# Altium footprint library generated_footprints.PcbLib: 38 footprints (part 2 of 3)
Each footprint in its own frame and in the unit in brackets; x right, y up, seen from the top. Pads: shape width x height; smd on the part's side, far side on the other; paste and mask are expansions set on the pad; w line width, h text height; cw(c..) or ccw(c..) is an arc to the next point about the centre after c.
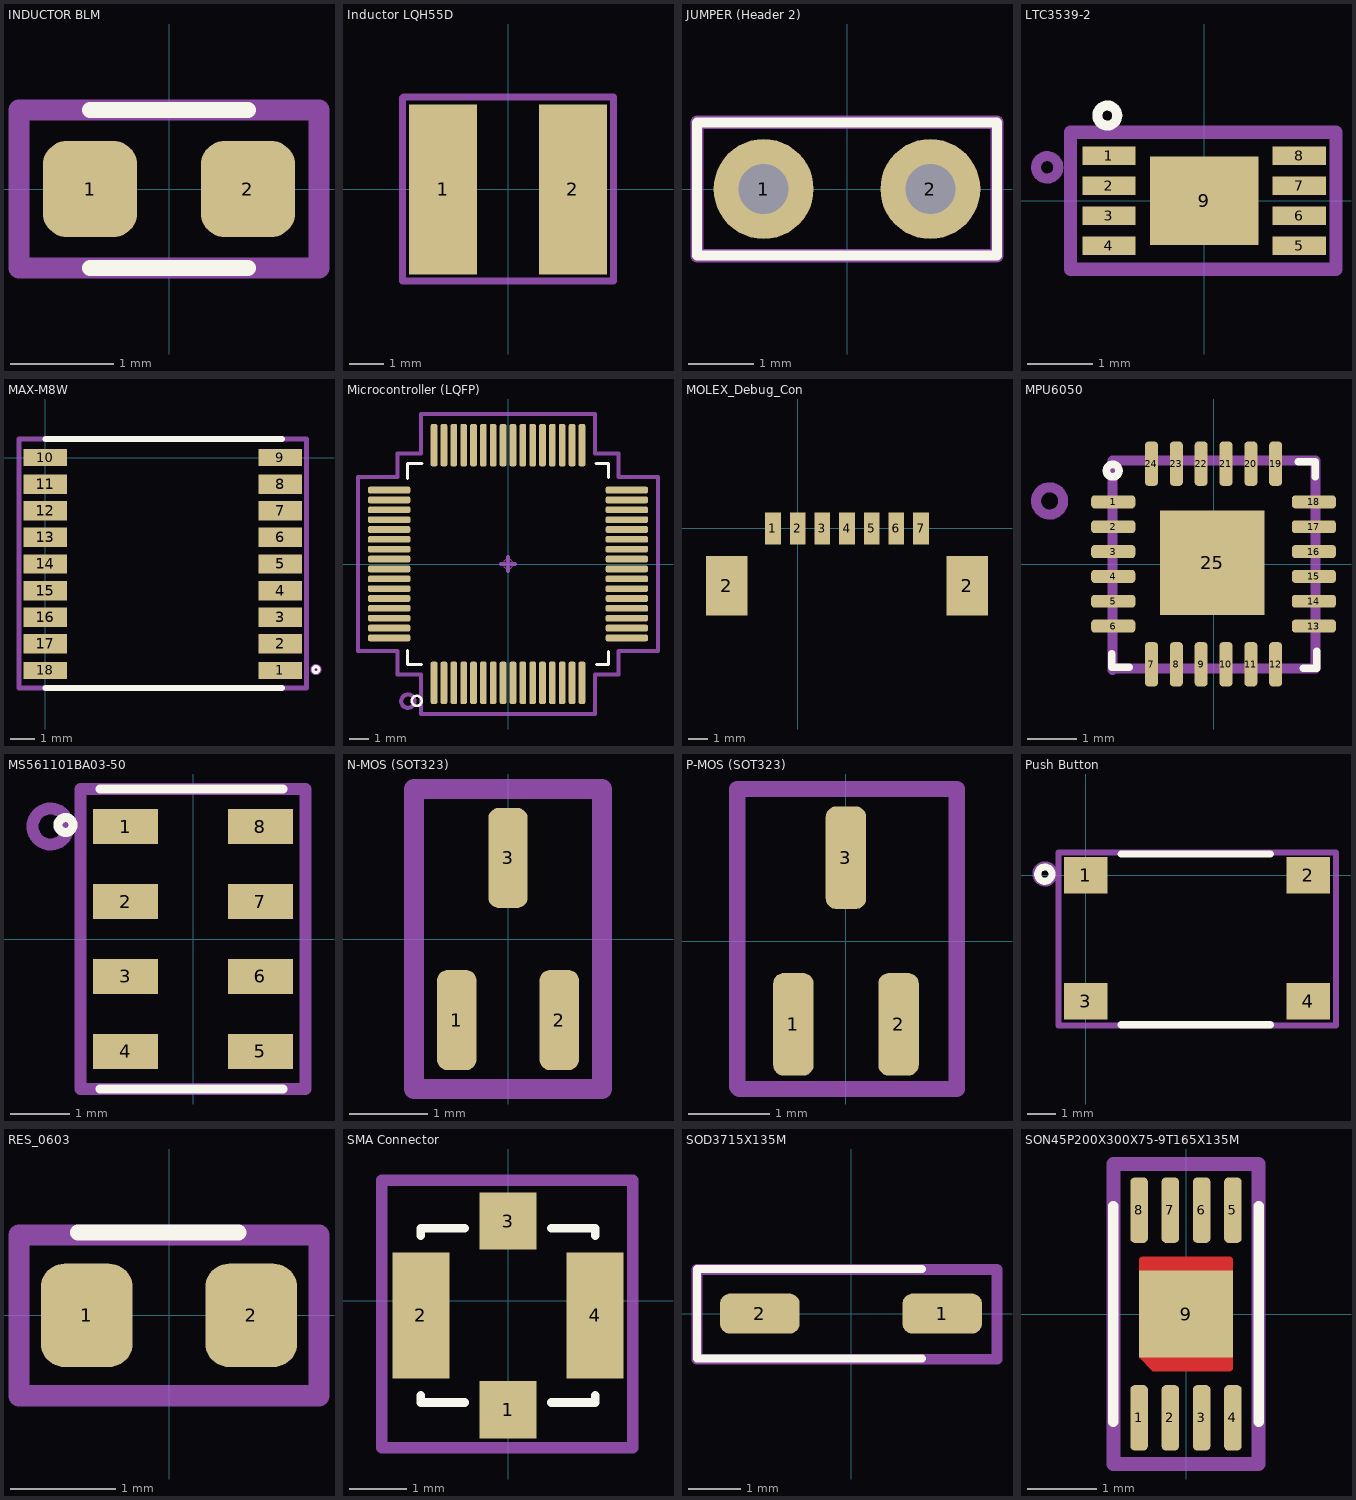
[diagram p1: the footprints below, top view; thin cyan lines are the x and y axes]

## INDUCTOR BLM [mm] "Inductor, Chip; 1.60 mm L X 0.80 mm W X 0.90 mm H body"
height 0.9
pads (2):
  rrect51% 0.91x0.93 smd: 1(-0.762,0) 2(0.762,0)
Top Overlay:
  lines w0.152: -0.762,-0.762 0.762,-0.762 ; -0.762,0.762 0.762,0.762
Mechanical 15:
  lines w0.203: -1.448,-0.762 1.448,-0.762 1.448,0.762 -1.448,0.762 -1.448,-0.762
  text ".Designator" at -1.041,-0.483 h1.52
3D body "User Library-INDC1608X___.step": height 1, standoff 0, extent -0.8,-0.4 0.8,0.4

## Inductor LQH55D [mm]
pads (2):
  rect 2x5 smd: 1(-1.905,0) 2(1.905,0)
Mechanical 15:
  lines w0.203: -3.099,2.692 -3.099,-2.692 3.099,-2.692 3.099,2.718 -3.073,2.718
  text ".Designator" at -0.813,-0.483 h1.52
3D body "User Library-LQH55D series.STEP": height 4.7, standoff 0, extent -2.85,-2.5 2.85,2.5

## JUMPER (Header 2) [mil]
pads (2):
  round 60 hole 30: 1(-50,0) 2(50,0)
Top Overlay:
  lines w6: -90,-40 -90,40 90,40 90,-40 -90,-40
Mechanical 15:
  lines w8: -90,-40 -90,40 90,40 90,-40 -90,-40
  text ".Designator" at -40,-16 h60
3D body "User Library-1x2 TH Pitch 2_54mm.step": height 373.85, standoff -125.98, extent -100,-50 100,50

## LTC3539-2 [mil]
pads (9):
  rect 32x11 smd paste-1000 mask-1000: 1(-57,27) 2(-57,9) 3(-57,-9) 4(-57,-27) 5(57,-27) 6(57,-9) 7(57,9) 8(57,27)
  rect 65x53 smd paste-1000 mask-1000: 9(0,0)
Top Overlay:
  circle w6: c-58,51 r6
Top Paste:
  region: -73,21.5 -41,21.5 -41,32.5 -73,32.5
  region: -73,3.5 -41,3.5 -41,14.5 -73,14.5
  region: -73,-14.5 -41,-14.5 -41,-3.5 -73,-3.5
  region: -73,-32.5 -41,-32.5 -41,-21.5 -73,-21.5
  region: 41,-32.5 73,-32.5 73,-21.5 41,-21.5
  region: 41,-14.5 73,-14.5 73,-3.5 41,-3.5
  region: 41,3.5 73,3.5 73,14.5 41,14.5
  region: 41,21.5 73,21.5 73,32.5 41,32.5
  region: -32.5,-26.5 32.5,-26.5 32.5,26.5 -32.5,26.5
Top Solder:
  region: -76,17.56 -39,17.56 -39,36.44 -76,36.44
  region: -76,-0.44 -39,-0.44 -39,18.44 -76,18.44
  region: -76,-18.44 -39,-18.44 -39,0.44 -76,0.44
  region: -76,-36.44 -39,-36.44 -39,-17.56 -76,-17.56
  region: 39,-36.44 75,-36.44 75,-17.56 39,-17.56
  region: 39,-18.44 75,-18.44 75,0.44 39,0.44
  region: 39,-0.44 75,-0.44 75,18.44 39,18.44
  region: 39,17.56 75,17.56 75,36.44 39,36.44
  region: -35,-30 35,-30 35,30 -35,30
Mechanical 15:
  circle w6: c-94,20 r6.71
  lines w8: -80,-41 -80,41 79,41 79,-41 -80,-41
  text ".Designator" at -41,-17 h60
3D body "User Library-DFN-8-1.step": height 29.53, standoff -1.97, extent -61.02,-39.36 61.03,39.37

## MAX-M8W [mm]
height 10
pads (18):
  rect 1.8x0.7 smd mask+0.089: 1(9.7,-8.8) 9(9.7,0) 10(0,0) 18(0,-8.8)
  rect 1.8x0.8 smd mask+0.089: 2(9.7,-7.7) 3(9.7,-6.6) 4(9.7,-5.5) 5(9.7,-4.4) 6(9.7,-3.3) 7(9.7,-2.2) 8(9.7,-1.1) 11(0,-1.1) 12(0,-2.2) 13(0,-3.3) 14(0,-4.4) 15(0,-5.5) 16(0,-6.6) 17(0,-7.7)
Top Overlay:
  circle w0.127: c11.176,-8.763 r0.127
  lines w0.254: 0,-9.525 9.779,-9.525 ; 0,0.762 9.779,0.762
Mechanical 15:
  circle w0.203: c11.176,-8.763 r0.127
  lines w0.203: -1.092,-9.525 10.795,-9.525 10.795,0.762 -1.092,0.762 -1.092,-9.525
  text ".Designator" at 3.327,-4.877 h1.52
3D body "MAX.STEP": height 2.47, standoff 0, extent -0.024,-9.465 9.676,0.635

## Microcontroller (LQFP) [mm] "Quad Flat Pack (QFP), 0.50 mm pitch; square, 16 pin X 16 pin, 10.00 mm L X 10.00 mm W X 1.20 mm H body"
height 1.2
pads (64):
  rrect53% 0.34x2.15 smd: 1(-3.75,-6.03) 2(-3.25,-6.03) 3(-2.75,-6.03) 4(-2.25,-6.03) 5(-1.75,-6.03) 6(-1.25,-6.03) 7(-0.75,-6.03) 8(-0.25,-6.03) 9(0.25,-6.03) 10(0.75,-6.03) 11(1.25,-6.03) 12(1.75,-6.03) 13(2.25,-6.03) 14(2.75,-6.03) 15(3.25,-6.03) 16(3.75,-6.03) 33(3.75,6.03) 34(3.25,6.03) 35(2.75,6.03) 36(2.25,6.03) 37(1.75,6.03) 38(1.25,6.03) 39(0.75,6.03) 40(0.25,6.03) 41(-0.25,6.03) 42(-0.75,6.03) 43(-1.25,6.03) 44(-1.75,6.03) 45(-2.25,6.03) 46(-2.75,6.03) 47(-3.25,6.03) 48(-3.75,6.03)
  rrect53% 2.15x0.34 smd: 17(6.03,-3.75) 18(6.03,-3.25) 19(6.03,-2.75) 20(6.03,-2.25) 21(6.03,-1.75) 22(6.03,-1.25) 23(6.03,-0.75) 24(6.03,-0.25) 25(6.03,0.25) 26(6.03,0.75) 27(6.03,1.25) 28(6.03,1.75) 29(6.03,2.25) 30(6.03,2.75) 31(6.03,3.25) 32(6.03,3.75) 49(-6.03,3.75) 50(-6.03,3.25) 51(-6.03,2.75) 52(-6.03,2.25) 53(-6.03,1.75) 54(-6.03,1.25) 55(-6.03,0.75) 56(-6.03,0.25) 57(-6.03,-0.25) 58(-6.03,-0.75) 59(-6.03,-1.25) 60(-6.03,-1.75) 61(-6.03,-2.25) 62(-6.03,-2.75) 63(-6.03,-3.25) 64(-6.03,-3.75)
Top Overlay:
  circle w0.127: c-4.629,-6.943 r0.254
  lines w0.15: -5.1,-4.394 -5.1,-5.1 -4.394,-5.1 ; -5.1,4.343 -5.1,5.1 -4.369,5.1 ; 4.47,5.1 5.1,5.1 5.1,4.394 ; 4.496,-5.1 5.1,-5.1
  lines w0.152: 5.1,-5.1 5.1,-4.445
Mechanical 15:
  circle w0.203: c-5.08,-6.96 r0.339
  circle w0.05: c0,0 r0.25
  lines w0.203: -0.35,0 0.35,0 ; 0,-0.35 0,0.35 ; -7.61,-4.42 -5.6,-4.42 -5.6,-5.6 -4.42,-5.6 -4.42,-7.61 4.42,-7.61 4.42,-5.6 5.6,-5.6 5.6,-4.42 7.61,-4.42 7.61,4.42 5.6,4.42 5.6,5.6 4.42,5.6 4.42,7.61 -4.42,7.61 -4.42,5.6 -5.6,5.6 -5.6,4.42 -7.61,4.42 -7.61,-4.42
  text ".Designator" at -1.016,-1.956 h2.54
3D body "User Library-LQFP64-1.step": height 1.56, standoff 0, extent -6,-6 6,6

## MOLEX_Debug_Con [mm]
pads (9):
  rect 0.8x1.6 smd: 1(-1.25,0) 2(0,0) 3(1.25,0) 4(2.5,0) 5(3.75,0) 6(5,0) 7(6.25,0)
  rect 2.1x3 smd: 2(-3.6,-2.9) 2(8.6,-2.9)
3D body "532610771.stp": height 3.4, standoff 0, extent -4.45,-4.7 9.45,0.5

## MPU6050 [mm] "Quad Flat No-Lead (QFN with Tab), 0.50 mm pitch; square, 6 pin X 6 pin, 4.00 mm L X 4.00 mm W X 0.95 mm H body"
height 0.95
pads (25):
  rrect54% 0.89x0.26 smd mask+0.114: 1(-2.02,1.25) 6(-2.02,-1.25) 13(2.02,-1.25) 18(2.02,1.25)
  rrect54% 0.89x0.26 smd mask+0.127: 2(-2.02,0.75) 3(-2.02,0.25) 4(-2.02,-0.25) 5(-2.02,-0.75) 14(2.02,-0.75) 15(2.02,-0.25) 16(2.02,0.25) 17(2.02,0.75)
  rrect54% 0.26x0.89 smd mask+0.114: 7(-1.25,-2.02) 12(1.25,-2.02) 19(1.25,2.02) 24(-1.25,2.02)
  rrect54% 0.26x0.89 smd mask+0.127: 8(-0.75,-2.02) 9(-0.25,-2.02) 10(0.25,-2.02) 11(0.75,-2.02) 20(0.75,2.02) 21(0.25,2.02) 22(-0.25,2.02) 23(-0.75,2.02)
  rect 2.108x2.108 smd: 25(-0.025,0.025)
Top Overlay:
  circle w0.152: c-2.032,1.88 r0.127
  lines w0.15: -2.05,-2.075 -1.702,-2.075 ; 1.702,2.057 2.05,2.057 ; 2.075,-2.101 2.075,-1.753
  lines w0.152: -2.05,-2.075 -2.05,-1.803 ; 1.803,-2.101 2.075,-2.101 ; 2.05,1.753 2.05,2.057
Mechanical 15:
  circle w0.203: c-3.302,1.27 r0.274
  lines w0.203: -2.032,-2.134 -2.032,2.083 2.05,2.083 2.05,-2.108 -2.032,-2.108
  text ".Designator" at -0.864,-0.483 h1.52
3D body "User Library-mpu-6050_qfn-24.step": height 0.88, standoff -0.02, extent -2.007,-2.071 2.033,1.969

## MS561101BA03-50 [mm]
pads (8):
  rect 1.1x0.6 smd: 1(-1.143,1.905) 2(-1.143,0.635) 3(-1.143,-0.635) 4(-1.143,-1.905) 5(1.143,-1.905) 6(1.143,-0.635) 7(1.143,0.635) 8(1.143,1.905)
Top Overlay:
  circle w0.152: c-2.159,1.93 r0.127
  lines w0.152: -1.575,-2.54 1.524,-2.54 ; -1.575,2.54 1.524,2.54
Mechanical 15:
  circle w0.203: c-2.413,1.905 r0.305
  lines w0.203: -1.905,-2.54 -1.905,2.54 1.905,2.54 1.905,-2.54 -1.905,-2.54
  text ".Designator" at -0.584,-0.406 h1.52
3D body "User Library-MS5611-01BA03.step": height 1, standoff -0.05, extent -1.493,-2.512 1.507,2.488

## N-MOS (SOT323) [mm] "Small Outline Transistor (SOT23), 0.65 mm pitch; 3 pin, 0.95 mm L X 1.25 mm W X 1.00 mm H body"
height 1
pads (3):
  rrect52% 0.5x1.27 smd: 1(-0.65,-1.03) 2(0.65,-1.03) 3(0,1.03)
Mechanical 15:
  lines w0.254: -1.194,-1.905 -1.194,1.905 1.194,1.905 1.194,-1.905 -1.194,-1.905
  text ".Designator" at -0.533,-0.533 h1.52
3D body "User Library-SOT323 (SC70-3)-1.STEP": height 1.1, standoff 0, extent -1.1,-1.122 1.1,1.123

## P-MOS (SOT323) [mm]
pads (3):
  rrect52% 0.5x1.27 smd: 1(-0.65,-1.03) 2(0.65,-1.03) 3(0,1.03)
Mechanical 15:
  lines w0.203: -1.346,-1.803 -1.346,1.88 1.372,1.88 1.372,-1.829 -1.321,-1.829
  text ".Designator" at -0.559,-0.381 h1.52
3D body "User Library-SOT323 (SC70-3)-1.STEP": height 1.1, standoff 0, extent -1.1,-1.148 1.1,1.097

## Push Button [mm]
pads (4):
  rect 1.55x1.3 smd: 1(0,0) 2(7.95,0) 3(0,-4.5) 4(7.95,-4.5)
Top Overlay:
  circle w0.254: c-1.454,0.042 r0.254
  lines w0.254: 1.27,-5.334 6.604,-5.334 ; 1.27,0.762 6.604,0.762
Mechanical 15:
  circle w0.254: c-1.448,0.051 r0.321
  lines w0.203: -0.965,-5.359 8.941,-5.359 8.941,0.813 -0.965,0.813 -0.965,-5.359
  text ".Designator" at 2.946,-2.642 h1.52
3D body "User Library-PTS645SL50SMTR92-LFS.STEP": height 5, standoff 0, extent -0.563,-5.286 8.437,0.714

## RES_0603 [mm] "Resistor, Chip; 1.60 mm L X 0.85 mm W X 0.55 mm H body"
height 2
pads (2):
  rrect51% 0.87x0.98 smd: 1(-0.78,0) 2(0.78,0)
Top Overlay:
  lines w0.152: -0.864,0.787 0.66,0.787
Mechanical 15:
  lines w0.203: -1.422,-0.762 -1.422,0.762 1.422,0.762 1.422,-0.762 -1.422,-0.762
  text ".Designator" at -0.94,-0.432 h1.52
3D body "User Library-RES_1609-0603.STEP": height 0.56, standoff 0, extent -0.85,-0.419 0.85,0.381

## SMA Connector [mm]
pads (4):
  rect 1x1 smd: 1(0,-1.905) 3(0,1.397)
  rect 1x2.2 smd: 2(-1.524,-0.254) 4(1.524,-0.254)
Top Overlay:
  lines w0.152: -1.524,-1.651 -1.524,-1.778 -0.762,-1.778 ; -1.524,1.143 -1.524,1.27 -0.762,1.27 ; 0.762,-1.778 1.524,-1.778 1.524,-1.651 ; 0.762,1.27 1.524,1.27 1.524,1.143
Mechanical 15:
  lines w0.203: -2.21,-2.565 2.184,-2.565 2.184,2.108 -2.21,2.108 -2.21,-2.565
  text ".Designator" at -0.737,-0.686 h1.52
3D body "User Library-0734120110 - Molex - UMC Antenna Connector SMT.STEP": height 1.3, standoff 0, extent -1.5,-1.804 1.5,1.296

## SOD3715X135M [mm] "Small Outline Diode (SOD); 2.70 mm L X 1.55 mm W X 1.35 mm H body"
height 1.35
pads (2):
  rrect50% 1.51x0.76 smd: 1(1.73,0) 2(-1.73,0)
Top Overlay:
  lines w0.152: 1.35,-0.85 -2.921,-0.85 -2.921,0.85 1.35,0.85
Mechanical 15:
  lines w0.203: -2.921,-0.864 -2.921,0.838 2.769,0.838 2.769,-0.864 -2.921,-0.864
  text ".Designator" at -1.016,-0.381 h1.52
3D body "User Library-SOD123.step": height 1.27, standoff 0, extent -1.85,-0.8 1.85,0.8

## SON45P200X300X75-9T165X135M [mm] "Small Outline No-Lead (SON with Tab), 0.45 mm pitch; 8 pin, 2.00 mm L X 3.00 mm W X 0.75 mm H body"
height 0.75
pads (9):
  rrect48% 0.25x0.94 smd: 1(-0.675,-1.495) 2(-0.225,-1.495) 3(0.225,-1.495) 4(0.675,-1.495) 5(0.675,1.495) 6(0.225,1.495) 7(-0.225,1.495) 8(-0.675,1.495)
  rect 1.35x1.25 smd paste-1.35 mask+0: 9(0,0)
Top Layer:
  region: 0.675,0 0.675,-0.775 0.674,-0.783 0.673,-0.79 0.67,-0.798 0.666,-0.804 0.66,-0.81 0.654,-0.816 0.648,-0.82 0.64,-0.823 0.633,-0.824 -0.475,-0.825 -0.675,-0.625 -0.675,0.775 -0.674,0.783 -0.673,0.79 -0.67,0.798 -0.666,0.804 -0.66,0.81 -0.654,0.816 -0.648,0.82 -0.64,0.823 -0.633,0.824 0.625,0.825 0.633,0.824 0.64,0.823 0.648,0.82 0.654,0.816 0.66,0.81 0.666,0.804 0.67,0.798 0.673,0.79 0.674,0.783 0.675,0.775
Top Overlay:
  lines w0.15: -1.05,-1.55 -1.05,1.55 ; 1.05,-1.55 1.05,1.55
Top Paste:
  region: 0.46,-0.68 -0.46,-0.68 -0.46,-0.07 0.46,-0.07
  region: 0.46,0.07 -0.46,0.07 -0.46,0.68 0.46,0.68
Top Solder:
  region: 0.675,0 0.675,-0.775 0.674,-0.783 0.673,-0.79 0.67,-0.798 0.666,-0.804 0.66,-0.81 0.654,-0.816 0.648,-0.82 0.64,-0.823 0.633,-0.824 -0.475,-0.825 -0.675,-0.625 -0.675,0.775 -0.674,0.783 -0.673,0.79 -0.67,0.798 -0.666,0.804 -0.66,0.81 -0.654,0.816 -0.648,0.82 -0.64,0.823 -0.633,0.824 0.625,0.825 0.633,0.824 0.64,0.823 0.648,0.82 0.654,0.816 0.66,0.81 0.666,0.804 0.67,0.798 0.673,0.79 0.674,0.783 0.675,0.775
Mechanical 11:
  lines w0.152: -1.05,-1.55 -1.05,1.55 ; 1.05,-1.55 1.05,1.55
Mechanical 15:
  lines w0.203: -1.041,-2.159 -1.041,-2.05 -1.041,2.159 1.041,2.159 1.041,-2.05 1.041,-2.159 -1.041,-2.159
  text ".Designator" at -0.381,-0.432 h1.52
3D body "User Library-DFN-8-1.step": height 0.75, standoff -0.05, extent -1,-1.55 1,1.55